# Altium footprint library XU-GENARAL PCB .PcbLib: 1176 footprints (part 70 of 75)
Each footprint in its own frame and in the unit in brackets; x right, y up, seen from the top. Pads: shape width x height; smd on the part's side, far side on the other; paste and mask are expansions set on the pad; w line width, h text height; cw(c..) or ccw(c..) is an arc to the next point about the centre after c.
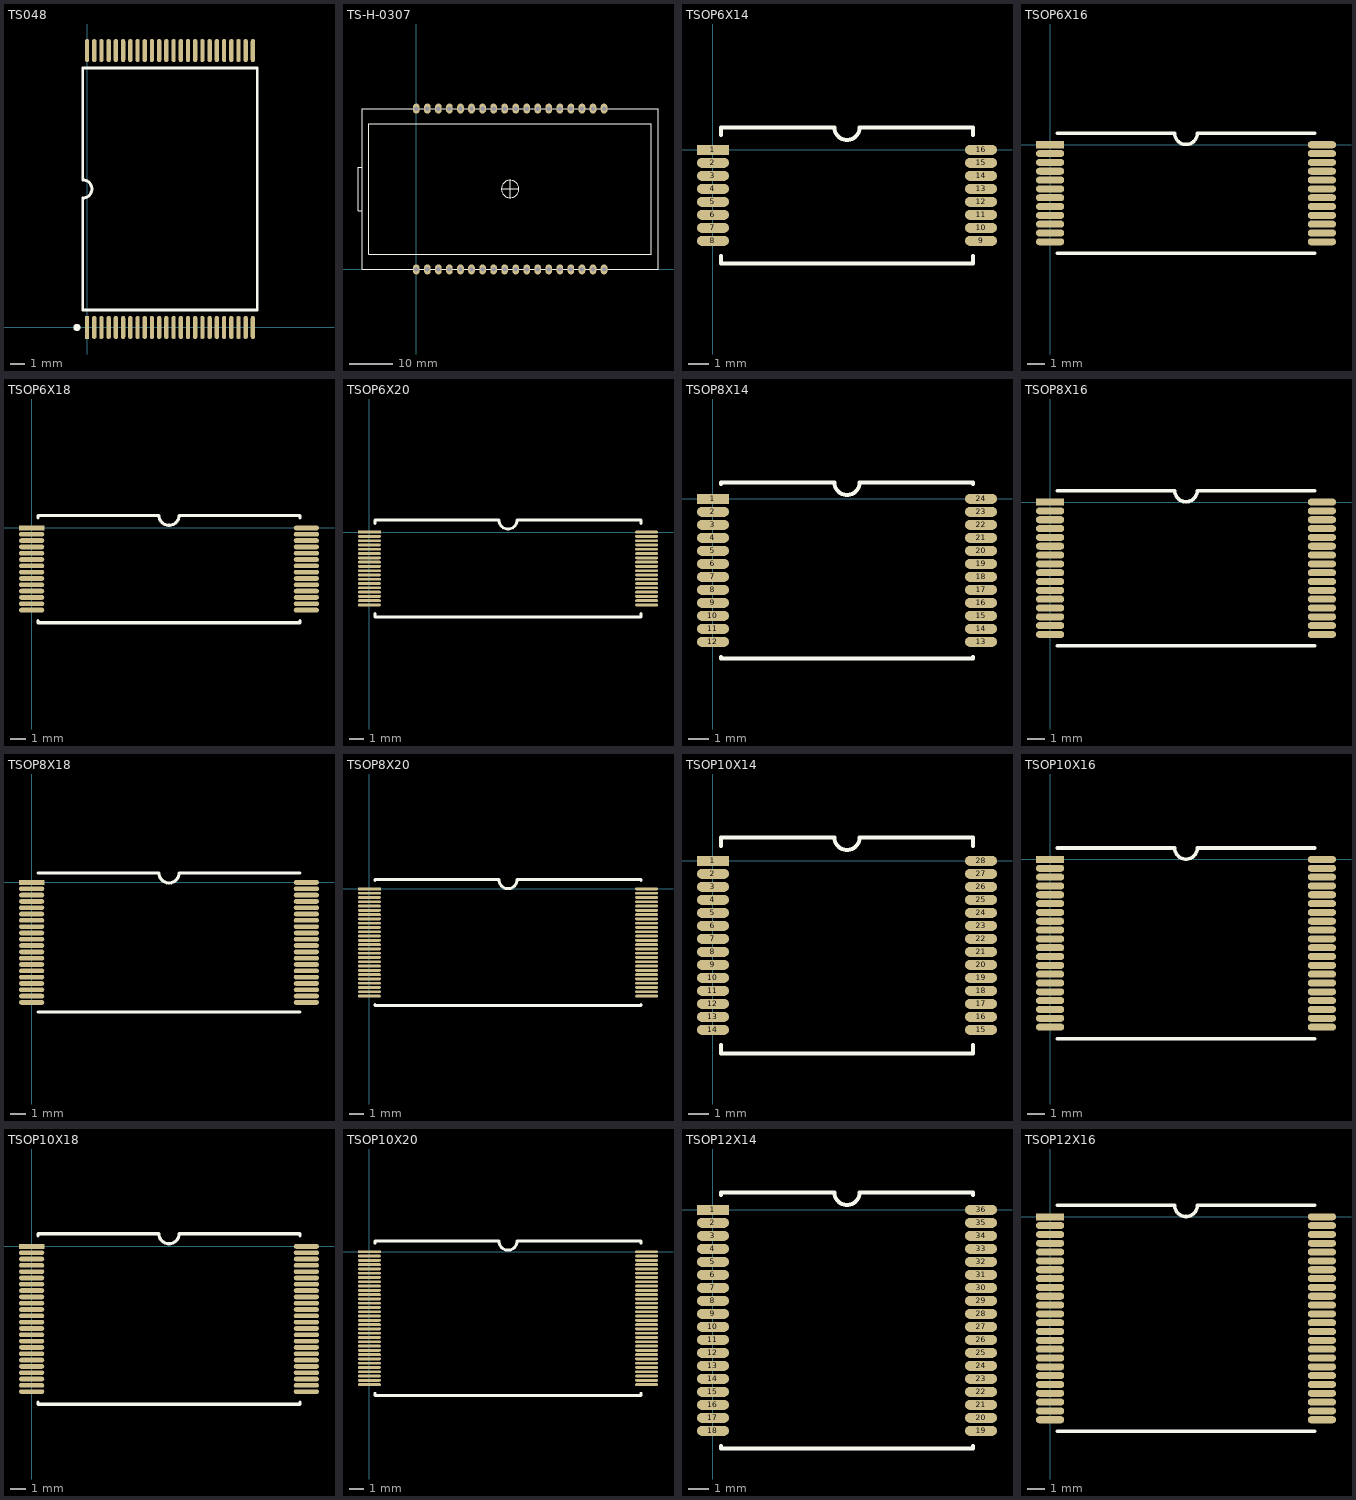
[diagram p69: the footprints below, top view; thin cyan lines are the x and y axes]

## TS048 [mm]
pads (48):
  rect 0.3x1.6 smd: 1(0,0)
  oval 0.3x1.6 smd: 2(0.5,0) 3(1,0) 4(1.5,0) 5(2,0) 6(2.5,0) 7(3,0) 8(3.5,0) 9(4,0) 10(4.5,0) 11(5,0) 12(5.5,0) 13(6,0) 14(6.5,0) 15(7,0) 16(7.5,0) 17(8,0) 18(8.5,0) 19(9,0) 20(9.5,0) 21(10,0) 22(10.5,0) 23(11,0) 24(11.5,0) 25(11.5,19.2) 26(11,19.2) 27(10.5,19.2) 28(10,19.2) 29(9.5,19.2) 30(9,19.2) 31(8.5,19.2) 32(8,19.2) 33(7.5,19.2) 34(7,19.2) 35(6.5,19.2) 36(6,19.2) 37(5.5,19.2) 38(5,19.2) 39(4.5,19.2) 40(4,19.2) 41(3.5,19.2) 42(3,19.2) 43(2.5,19.2) 44(2,19.2) 45(1.5,19.2) 46(1,19.2) 47(0.5,19.2) 48(0,19.2)
Top Overlay:
  circle w0.25: c-0.7,0 r0.125
  lines w0.2: -0.3,1.2 -0.3,8.965 ccw(c-0.3,9.6) -0.3,10.235 -0.3,18 11.8,18 11.8,1.2 -0.3,1.2

## TS-H-0307 [mil]
pads (38):
  oval 60x90 hole 40: 1(0,0) 1(0,0) 2(100,0) 3(200,0) 4(300,0) 5(400,0) 6(500,0) 7(600,0) 8(700,0) 9(800,0) 10(900,0) 11(1000,0) 12(1100,0) 13(1200,0) 14(1300,0) 15(1400,0) 16(1500,0) 17(1600,0) 18(1700,0) 19(1700,1456.69) 19(1700,1456.69) 20(1600,1456.69) 21(1500,1456.69) 22(1400,1456.69) 23(1300,1456.69) 24(1200,1456.69) 25(1100,1456.69) 26(1000,1456.69) 27(900,1456.69) 28(800,1456.69) 29(700,1456.69) 30(600,1456.69) 31(500,1456.69) 32(400,1456.69) 33(300,1456.69) 34(200,1456.69) 35(100,1456.69) 36(0,1456.69)
Top Overlay:
  circle w10: c850,728.35 r78.74
  lines w10: -490.08,531.5 -527.95,531.5 -527.95,728.35 -527.95,925.2 -488.78,925.2 ; 771.42,728.35 927.09,728.35 ; 850,650 850,807.09 ; -488.58,0 2188.58,0 2188.58,1456.69 -488.58,1456.69 -488.58,0 ; -429.53,137.8 2129.53,137.8 2129.53,1318.9 -429.53,1318.9 -429.53,137.8

## TSOP6X14 [mm]
pads (16):
  rect 1.6x0.5 smd: 1(0,0)
  oval 1.6x0.5 smd: 2(0,-0.65) 3(0,-1.3) 4(0,-1.95) 5(0,-2.6) 6(0,-3.25) 7(0,-3.9) 8(0,-4.55) 9(13.4,-4.55) 10(13.4,-3.9) 11(13.4,-3.25) 12(13.4,-2.6) 13(13.4,-1.95) 14(13.4,-1.3) 15(13.4,-0.65) 16(13.4,0)
Top Overlay:
  lines w0.2: 0.4,-5.3 0.4,-5.675 13,-5.675 13,-5.3 ; 0.4,0.75 0.4,1.125 6.065,1.125 ccw(c6.7,1.125) 7.335,1.125 13,1.125 13,0.75

## TSOP6X16 [mm]
pads (24):
  rect 1.6x0.4 smd: 1(0,0)
  oval 1.6x0.4 smd: 2(0,-0.5) 3(0,-1) 4(0,-1.5) 5(0,-2) 6(0,-2.5) 7(0,-3) 8(0,-3.5) 9(0,-4) 10(0,-4.5) 11(0,-5) 12(0,-5.5) 13(15.4,-5.5) 14(15.4,-5) 15(15.4,-4.5) 16(15.4,-4) 17(15.4,-3.5) 18(15.4,-3) 19(15.4,-2.5) 20(15.4,-2) 21(15.4,-1.5) 22(15.4,-1) 23(15.4,-0.5) 24(15.4,0)
Top Overlay:
  lines w0.2: 0.4,-6.15 15,-6.15 ; 0.4,0.65 7.065,0.65 ccw(c7.7,0.65) 8.335,0.65 15,0.65

## TSOP6X18 [mm]
pads (28):
  rect 1.6x0.3 smd: 1(0,0)
  oval 1.6x0.3 smd: 2(0,-0.4) 3(0,-0.8) 4(0,-1.2) 5(0,-1.6) 6(0,-2) 7(0,-2.4) 8(0,-2.8) 9(0,-3.2) 10(0,-3.6) 11(0,-4) 12(0,-4.4) 13(0,-4.8) 14(0,-5.2) 15(17.4,-5.2) 16(17.4,-4.8) 17(17.4,-4.4) 18(17.4,-4) 19(17.4,-3.6) 20(17.4,-3.2) 21(17.4,-2.8) 22(17.4,-2.4) 23(17.4,-2) 24(17.4,-1.6) 25(17.4,-1.2) 26(17.4,-0.8) 27(17.4,-0.4) 28(17.4,0)
Top Overlay:
  lines w0.2: 0.4,-5.85 0.4,-6 17,-6 17,-5.85 ; 0.4,0.65 0.4,0.8 8.065,0.8 ccw(c8.7,0.8) 9.335,0.8 17,0.8 17,0.65

## TSOP6X20 [mm]
pads (36):
  rect 1.6x0.2 smd: 1(0,0)
  oval 1.6x0.2 smd: 2(0,-0.3) 3(0,-0.6) 4(0,-0.9) 5(0,-1.2) 6(0,-1.5) 7(0,-1.8) 8(0,-2.1) 9(0,-2.4) 10(0,-2.7) 11(0,-3) 12(0,-3.3) 13(0,-3.6) 14(0,-3.9) 15(0,-4.2) 16(0,-4.5) 17(0,-4.8) 18(0,-5.1) 19(19.4,-5.1) 20(19.4,-4.8) 21(19.4,-4.5) 22(19.4,-4.2) 23(19.4,-3.9) 24(19.4,-3.6) 25(19.4,-3.3) 26(19.4,-3) 27(19.4,-2.7) 28(19.4,-2.4) 29(19.4,-2.1) 30(19.4,-1.8) 31(19.4,-1.5) 32(19.4,-1.2) 33(19.4,-0.9) 34(19.4,-0.6) 35(19.4,-0.3) 36(19.4,0)
Top Overlay:
  lines w0.2: 0.4,-5.7 0.4,-5.95 19,-5.95 19,-5.7 ; 0.4,0.6 0.4,0.85 9.065,0.85 ccw(c9.7,0.85) 10.335,0.85 19,0.85 19,0.6

## TSOP8X14 [mm]
pads (24):
  rect 1.6x0.5 smd: 1(0,0)
  oval 1.6x0.5 smd: 2(0,-0.65) 3(0,-1.3) 4(0,-1.95) 5(0,-2.6) 6(0,-3.25) 7(0,-3.9) 8(0,-4.55) 9(0,-5.2) 10(0,-5.85) 11(0,-6.5) 12(0,-7.15) 13(13.4,-7.15) 14(13.4,-6.5) 15(13.4,-5.85) 16(13.4,-5.2) 17(13.4,-4.55) 18(13.4,-3.9) 19(13.4,-3.25) 20(13.4,-2.6) 21(13.4,-1.95) 22(13.4,-1.3) 23(13.4,-0.65) 24(13.4,0)
Top Overlay:
  lines w0.2: 0.4,-7.9 0.4,-7.975 13,-7.975 13,-7.9 ; 0.4,0.75 0.4,0.825 6.065,0.825 ccw(c6.7,0.825) 7.335,0.825 13,0.825 13,0.75

## TSOP8X16 [mm]
pads (32):
  rect 1.6x0.4 smd: 1(0,0)
  oval 1.6x0.4 smd: 2(0,-0.5) 3(0,-1) 4(0,-1.5) 5(0,-2) 6(0,-2.5) 7(0,-3) 8(0,-3.5) 9(0,-4) 10(0,-4.5) 11(0,-5) 12(0,-5.5) 13(0,-6) 14(0,-6.5) 15(0,-7) 16(0,-7.5) 17(15.4,-7.5) 18(15.4,-7) 19(15.4,-6.5) 20(15.4,-6) 21(15.4,-5.5) 22(15.4,-5) 23(15.4,-4.5) 24(15.4,-4) 25(15.4,-3.5) 26(15.4,-3) 27(15.4,-2.5) 28(15.4,-2) 29(15.4,-1.5) 30(15.4,-1) 31(15.4,-0.5) 32(15.4,0)
Top Overlay:
  lines w0.2: 0.4,-8.15 15,-8.15 ; 0.4,0.65 7.065,0.65 ccw(c7.7,0.65) 8.335,0.65 15,0.65

## TSOP8X18 [mm]
pads (40):
  rect 1.6x0.3 smd: 1(0,0)
  oval 1.6x0.3 smd: 2(0,-0.4) 3(0,-0.8) 4(0,-1.2) 5(0,-1.6) 6(0,-2) 7(0,-2.4) 8(0,-2.8) 9(0,-3.2) 10(0,-3.6) 11(0,-4) 12(0,-4.4) 13(0,-4.8) 14(0,-5.2) 15(0,-5.6) 16(0,-6) 17(0,-6.4) 18(0,-6.8) 19(0,-7.2) 20(0,-7.6) 21(17.4,-7.6) 22(17.4,-7.2) 23(17.4,-6.8) 24(17.4,-6.4) 25(17.4,-6) 26(17.4,-5.6) 27(17.4,-5.2) 28(17.4,-4.8) 29(17.4,-4.4) 30(17.4,-4) 31(17.4,-3.6) 32(17.4,-3.2) 33(17.4,-2.8) 34(17.4,-2.4) 35(17.4,-2) 36(17.4,-1.6) 37(17.4,-1.2) 38(17.4,-0.8) 39(17.4,-0.4) 40(17.4,0)
Top Overlay:
  lines w0.2: 0.4,-8.2 17,-8.2 ; 0.4,0.6 8.065,0.6 ccw(c8.7,0.6) 9.335,0.6 17,0.6

## TSOP8X20 [mm]
pads (52):
  rect 1.6x0.2 smd: 1(0,0)
  oval 1.6x0.2 smd: 2(0,-0.3) 3(0,-0.6) 4(0,-0.9) 5(0,-1.2) 6(0,-1.5) 7(0,-1.8) 8(0,-2.1) 9(0,-2.4) 10(0,-2.7) 11(0,-3) 12(0,-3.3) 13(0,-3.6) 14(0,-3.9) 15(0,-4.2) 16(0,-4.5) 17(0,-4.8) 18(0,-5.1) 19(0,-5.4) 20(0,-5.7) 21(0,-6) 22(0,-6.3) 23(0,-6.6) 24(0,-6.9) 25(0,-7.2) 26(0,-7.5) 27(19.4,-7.5) 28(19.4,-7.2) 29(19.4,-6.9) 30(19.4,-6.6) 31(19.4,-6.3) 32(19.4,-6) 33(19.4,-5.7) 34(19.4,-5.4) 35(19.4,-5.1) 36(19.4,-4.8) 37(19.4,-4.5) 38(19.4,-4.2) 39(19.4,-3.9) 40(19.4,-3.6) 41(19.4,-3.3) 42(19.4,-3) 43(19.4,-2.7) 44(19.4,-2.4) 45(19.4,-2.1) 46(19.4,-1.8) 47(19.4,-1.5) 48(19.4,-1.2) 49(19.4,-0.9) 50(19.4,-0.6) 51(19.4,-0.3) 52(19.4,0)
Top Overlay:
  lines w0.2: 0.4,-8.1 0.4,-8.15 19,-8.15 19,-8.1 ; 0.4,0.6 0.4,0.65 9.065,0.65 ccw(c9.7,0.65) 10.335,0.65 19,0.65 19,0.6

## TSOP10X14 [mm]
pads (28):
  rect 1.6x0.5 smd: 1(0,0)
  oval 1.6x0.5 smd: 2(0,-0.65) 3(0,-1.3) 4(0,-1.95) 5(0,-2.6) 6(0,-3.25) 7(0,-3.9) 8(0,-4.55) 9(0,-5.2) 10(0,-5.85) 11(0,-6.5) 12(0,-7.15) 13(0,-7.8) 14(0,-8.45) 15(13.4,-8.45) 16(13.4,-7.8) 17(13.4,-7.15) 18(13.4,-6.5) 19(13.4,-5.85) 20(13.4,-5.2) 21(13.4,-4.55) 22(13.4,-3.9) 23(13.4,-3.25) 24(13.4,-2.6) 25(13.4,-1.95) 26(13.4,-1.3) 27(13.4,-0.65) 28(13.4,0)
Top Overlay:
  lines w0.2: 0.4,-9.2 0.4,-9.625 13,-9.625 13,-9.2 ; 0.4,0.75 0.4,1.175 6.065,1.175 ccw(c6.7,1.175) 7.335,1.175 13,1.175 13,0.75

## TSOP10X16 [mm]
pads (40):
  rect 1.6x0.4 smd: 1(0,0)
  oval 1.6x0.4 smd: 2(0,-0.5) 3(0,-1) 4(0,-1.5) 5(0,-2) 6(0,-2.5) 7(0,-3) 8(0,-3.5) 9(0,-4) 10(0,-4.5) 11(0,-5) 12(0,-5.5) 13(0,-6) 14(0,-6.5) 15(0,-7) 16(0,-7.5) 17(0,-8) 18(0,-8.5) 19(0,-9) 20(0,-9.5) 21(15.4,-9.5) 22(15.4,-9) 23(15.4,-8.5) 24(15.4,-8) 25(15.4,-7.5) 26(15.4,-7) 27(15.4,-6.5) 28(15.4,-6) 29(15.4,-5.5) 30(15.4,-5) 31(15.4,-4.5) 32(15.4,-4) 33(15.4,-3.5) 34(15.4,-3) 35(15.4,-2.5) 36(15.4,-2) 37(15.4,-1.5) 38(15.4,-1) 39(15.4,-0.5) 40(15.4,0)
Top Overlay:
  lines w0.2: 0.4,-10.15 15,-10.15 ; 0.4,0.65 7.065,0.65 ccw(c7.7,0.65) 8.335,0.65 15,0.65

## TSOP10X18 [mm]
pads (48):
  rect 1.6x0.3 smd: 1(0,0)
  oval 1.6x0.3 smd: 2(0,-0.4) 3(0,-0.8) 4(0,-1.2) 5(0,-1.6) 6(0,-2) 7(0,-2.4) 8(0,-2.8) 9(0,-3.2) 10(0,-3.6) 11(0,-4) 12(0,-4.4) 13(0,-4.8) 14(0,-5.2) 15(0,-5.6) 16(0,-6) 17(0,-6.4) 18(0,-6.8) 19(0,-7.2) 20(0,-7.6) 21(0,-8) 22(0,-8.4) 23(0,-8.8) 24(0,-9.2) 25(17.4,-9.2) 26(17.4,-8.8) 27(17.4,-8.4) 28(17.4,-8) 29(17.4,-7.6) 30(17.4,-7.2) 31(17.4,-6.8) 32(17.4,-6.4) 33(17.4,-6) 34(17.4,-5.6) 35(17.4,-5.2) 36(17.4,-4.8) 37(17.4,-4.4) 38(17.4,-4) 39(17.4,-3.6) 40(17.4,-3.2) 41(17.4,-2.8) 42(17.4,-2.4) 43(17.4,-2) 44(17.4,-1.6) 45(17.4,-1.2) 46(17.4,-0.8) 47(17.4,-0.4) 48(17.4,0)
Top Overlay:
  lines w0.2: 0.4,-9.85 0.4,-10 17,-10 17,-9.85 ; 0.4,0.65 0.4,0.8 8.065,0.8 ccw(c8.7,0.8) 9.335,0.8 17,0.8 17,0.65

## TSOP10X20 [mm]
pads (64):
  rect 1.6x0.2 smd: 1(0,0)
  oval 1.6x0.2 smd: 2(0,-0.3) 3(0,-0.6) 4(0,-0.9) 5(0,-1.2) 6(0,-1.5) 7(0,-1.8) 8(0,-2.1) 9(0,-2.4) 10(0,-2.7) 11(0,-3) 12(0,-3.3) 13(0,-3.6) 14(0,-3.9) 15(0,-4.2) 16(0,-4.5) 17(0,-4.8) 18(0,-5.1) 19(0,-5.4) 20(0,-5.7) 21(0,-6) 22(0,-6.3) 23(0,-6.6) 24(0,-6.9) 25(0,-7.2) 26(0,-7.5) 27(0,-7.8) 28(0,-8.1) 29(0,-8.4) 30(0,-8.7) 31(0,-9) 32(0,-9.3) 33(19.4,-9.3) 34(19.4,-9) 35(19.4,-8.7) 36(19.4,-8.4) 37(19.4,-8.1) 38(19.4,-7.8) 39(19.4,-7.5) 40(19.4,-7.2) 41(19.4,-6.9) 42(19.4,-6.6) 43(19.4,-6.3) 44(19.4,-6) 45(19.4,-5.7) 46(19.4,-5.4) 47(19.4,-5.1) 48(19.4,-4.8) 49(19.4,-4.5) 50(19.4,-4.2) 51(19.4,-3.9) 52(19.4,-3.6) 53(19.4,-3.3) 54(19.4,-3) 55(19.4,-2.7) 56(19.4,-2.4) 57(19.4,-2.1) 58(19.4,-1.8) 59(19.4,-1.5) 60(19.4,-1.2) 61(19.4,-0.9) 62(19.4,-0.6) 63(19.4,-0.3) 64(19.4,0)
Top Overlay:
  lines w0.2: 0.4,-9.9 0.4,-10.05 19,-10.05 19,-9.9 ; 0.4,0.6 0.4,0.75 9.065,0.75 ccw(c9.7,0.75) 10.335,0.75 19,0.75 19,0.6

## TSOP12X14 [mm]
pads (36):
  rect 1.6x0.5 smd: 1(0,0)
  oval 1.6x0.5 smd: 2(0,-0.65) 3(0,-1.3) 4(0,-1.95) 5(0,-2.6) 6(0,-3.25) 7(0,-3.9) 8(0,-4.55) 9(0,-5.2) 10(0,-5.85) 11(0,-6.5) 12(0,-7.15) 13(0,-7.8) 14(0,-8.45) 15(0,-9.1) 16(0,-9.75) 17(0,-10.4) 18(0,-11.05) 19(13.4,-11.05) 20(13.4,-10.4) 21(13.4,-9.75) 22(13.4,-9.1) 23(13.4,-8.45) 24(13.4,-7.8) 25(13.4,-7.15) 26(13.4,-6.5) 27(13.4,-5.85) 28(13.4,-5.2) 29(13.4,-4.55) 30(13.4,-3.9) 31(13.4,-3.25) 32(13.4,-2.6) 33(13.4,-1.95) 34(13.4,-1.3) 35(13.4,-0.65) 36(13.4,0)
Top Overlay:
  lines w0.2: 0.4,-11.8 0.4,-11.925 13,-11.925 13,-11.8 ; 0.4,0.75 0.4,0.875 6.065,0.875 ccw(c6.7,0.875) 7.335,0.875 13,0.875 13,0.75

## TSOP12X16 [mm]
pads (48):
  rect 1.6x0.4 smd: 1(0,0)
  oval 1.6x0.4 smd: 2(0,-0.5) 3(0,-1) 4(0,-1.5) 5(0,-2) 6(0,-2.5) 7(0,-3) 8(0,-3.5) 9(0,-4) 10(0,-4.5) 11(0,-5) 12(0,-5.5) 13(0,-6) 14(0,-6.5) 15(0,-7) 16(0,-7.5) 17(0,-8) 18(0,-8.5) 19(0,-9) 20(0,-9.5) 21(0,-10) 22(0,-10.5) 23(0,-11) 24(0,-11.5) 25(15.4,-11.5) 26(15.4,-11) 27(15.4,-10.5) 28(15.4,-10) 29(15.4,-9.5) 30(15.4,-9) 31(15.4,-8.5) 32(15.4,-8) 33(15.4,-7.5) 34(15.4,-7) 35(15.4,-6.5) 36(15.4,-6) 37(15.4,-5.5) 38(15.4,-5) 39(15.4,-4.5) 40(15.4,-4) 41(15.4,-3.5) 42(15.4,-3) 43(15.4,-2.5) 44(15.4,-2) 45(15.4,-1.5) 46(15.4,-1) 47(15.4,-0.5) 48(15.4,0)
Top Overlay:
  lines w0.2: 0.4,-12.15 15,-12.15 ; 0.4,0.65 7.065,0.65 ccw(c7.7,0.65) 8.335,0.65 15,0.65